# Altium footprint library UP-ROBOT Connectors(2013-02-26).PcbLib: 121 footprints (part 8 of 8)
Each footprint in its own frame and in the unit in brackets; x right, y up, seen from the top. Pads: shape width x height; smd on the part's side, far side on the other; paste and mask are expansions set on the pad; w line width, h text height; cw(c..) or ccw(c..) is an arc to the next point about the centre after c.
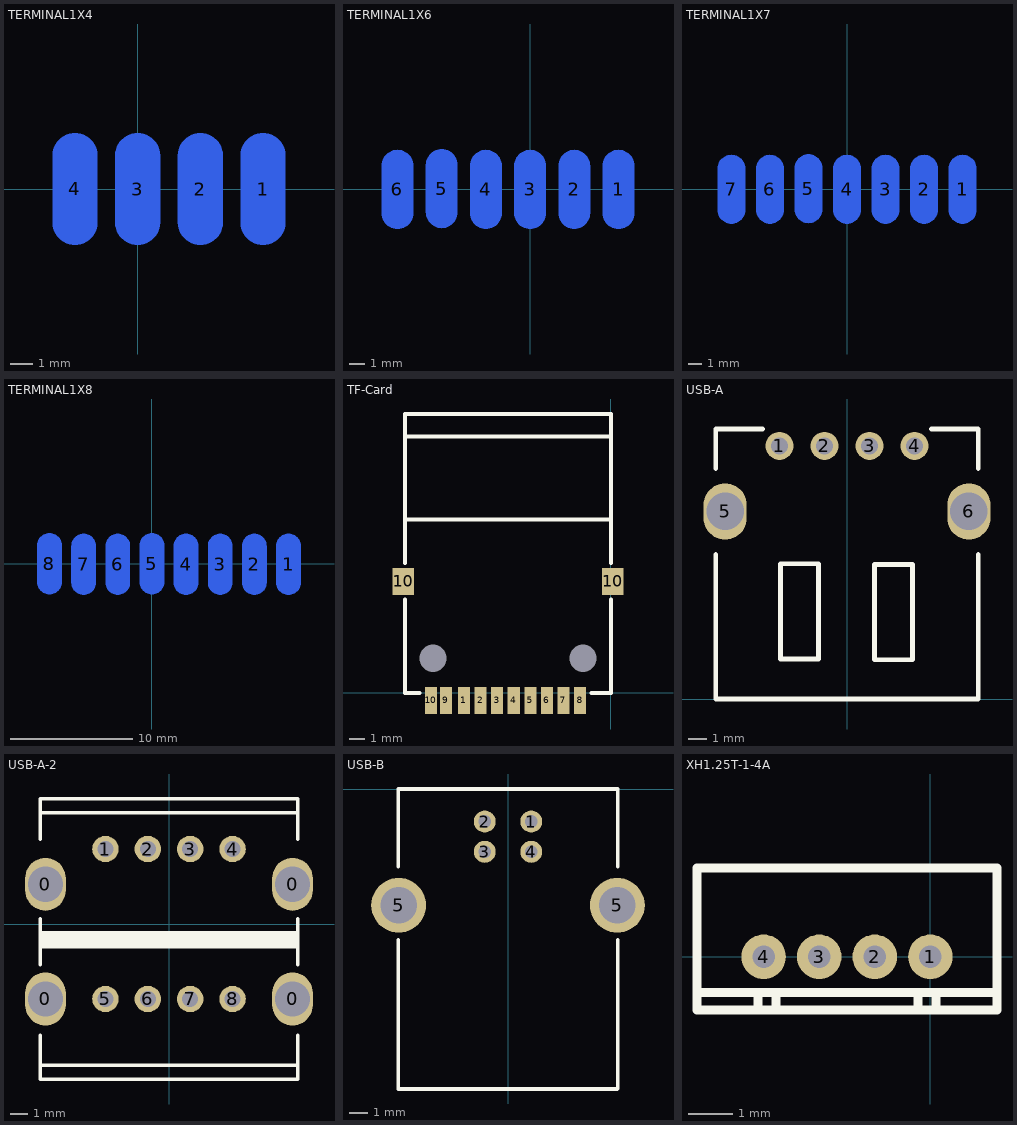
[diagram p7: the footprints below, top view; thin cyan lines are the x and y axes]

## TERMINAL1X4 [mm]
pads (4):
  oval 2x5 smd far side: 1(5.6,0) 2(2.8,0) 3(0,0) 4(-2.8,0)

## TERMINAL1X6 [mm]
pads (6):
  oval 2x5 smd far side: 1(5.6,0) 2(2.8,0) 3(0,0) 4(-2.8,0) 5(-5.6,0.05) 6(-8.4,0)

## TERMINAL1X7 [mm]
pads (7):
  oval 2x5 smd far side: 1(8.4,0) 2(5.6,0) 3(2.8,0) 4(0,0) 5(-2.8,0.05) 6(-5.6,0) 7(-8.4,0)

## TERMINAL1X8 [mm]
pads (8):
  oval 2x5 smd far side: 1(11.2,-0.05) 2(8.4,-0.05) 3(5.6,-0.05) 4(2.8,-0.05) 5(0,0) 6(-2.8,-0.05) 7(-5.6,-0.05) 8(-8.4,0)

## TF-Card [mm]
pads (14):
  rect 0.8x1.8 smd: 1(-9.745,-0.5) 2(-8.645,-0.5) 3(-7.545,-0.493) 4(-6.445,-0.5) 5(-5.345,-0.5) 6(-4.245,-0.5) 7(-3.145,-0.5) 8(-2.045,-0.5) 9(-10.945,-0.5) 10(-11.945,-0.5)
  rect 1.4x1.8 smd: 10(-13.775,7.4) 10(0.125,7.4)
  rect 0x0 hole 1.8: 11(-11.805,2.3) 11(-1.845,2.3)
Top Overlay:
  lines w0.254: -13.65,6.2 -13.65,0 -12.676,0 ; -13.65,8.6 -13.65,11.5 ; -13.643,17 0,17 ; -1.293,0 0,0 0,6.2 ; 0,8.6 0,11.5 ; -13.65,11.5 0,11.5 ; -13.65,11.5 -13.65,18.5 0,18.5 0,11.5
3D body: height 1.78, standoff -0.56, extent -13.87,-1.811 0.23,18.29

## USB-A [mm]
pads (6):
  round 1.5 hole 0.9: 1(-3.6,13.5) 2(-1.2,13.5) 3(1.2,13.5) 4(3.6,13.5)
  oval 2.3x3 hole 2: 5(-6.5,10) 6(6.5,10)
Top Overlay:
  lines w0.254: -7,7.7 -7,0 7,0 7,7.7 ; -7,12.3 -7,14.4 -4.5,14.4 ; 4.5,14.4 7,14.4 7,12.3 ; -3.552,2.132 -1.52,2.132 -1.52,7.212 -2.028,7.212 -3.552,7.212 -3.552,2.132 ; 1.463,2.097 3.495,2.097 3.495,7.177 2.987,7.177 1.463,7.177 1.463,2.097
3D body: height 7.95, standoff -3.19, extent -8.336,-0.115 8.436,15.15

## USB-A-2 [mm]
pads (12):
  oval 2.3x3 hole 2: 0(-7,-4.25) 0(-7,2.25) 0(7,-4.25) 0(7,2.25)
  round 1.5 hole 0.9: 1(-3.6,4.25) 2(-1.2,4.25) 3(1.2,4.25) 4(3.6,4.25) 5(-3.6,-4.25) 6(-1.2,-4.25) 7(1.2,-4.25) 8(3.6,-4.25)
Top Overlay:
  rectangle: -7.3,-1.4 7.3,-0.4
  lines w0.203: -7.3,-7.8 -7.3,-8.8 7.3,-8.8 7.3,-7.8 ; -7.3,-6.3 -7.3,-8 -0.2,-8 7.3,-8 7.3,-6.3 ; -7.3,-2.3 -7.3,0.3 ; -7.3,4.8 -7.3,6.3 ; 7.3,-2.3 7.3,0.3 ; 7.3,4.8 7.3,6.3 ; -7.3,6.3 1.5,6.3 7.3,6.3 ; -7.3,6.3 -7.3,7.1 7.3,7.1 7.3,6.3
3D body: height 20.58, standoff -2.44, extent -7.5,-8.8 7.499,7.11

## USB-B [mm]
pads (6):
  round 1.2 hole 0.7: 1(1.27,-1.778) 3(-1.27,-3.429) 4(1.27,-3.429)
  round 1.2 hole 0.7 paste+0: 2(-1.27,-1.778)
  round 3 hole 2: 5(-5.969,-6.35) 5(5.969,-6.35)
Top Overlay:
  lines w0.203: -6,-8.25 -6,-16.383 5.969,-16.383 ; -6,-4.25 -6,0 6,0 6,-4.25 ; 6,-16.352 6,-8.25
3D body: height 11, standoff -4.42, extent -7.454,-16.73 7.429,0.27

## XH1.25T-1-4A [mm]
pads (4):
  round 1 hole 0.5: 1(0,0) 2(-1.25,0) 3(-2.5,0) 4(-3.75,0)
Top Overlay:
  lines w0.2: -5.25,-0.8 1.5,-0.8 ; -3.875,-1.2 -3.875,-0.8 ; -3.475,-1.2 -3.475,-0.8 ; -0.275,-1.2 -0.275,-0.8 ; 0.125,-1.2 0.125,-0.8 ; -5.25,-1.2 1.5,-1.2 1.5,2 -5.25,2 -5.25,-1.2